# Altium footprint library Blue Tractor-2021.PcbLib: 82 footprints (part 5 of 6)
Each footprint in its own frame and in the unit in brackets; x right, y up, seen from the top. Pads: shape width x height; smd on the part's side, far side on the other; paste and mask are expansions set on the pad; w line width, h text height; cw(c..) or ccw(c..) is an arc to the next point about the centre after c.
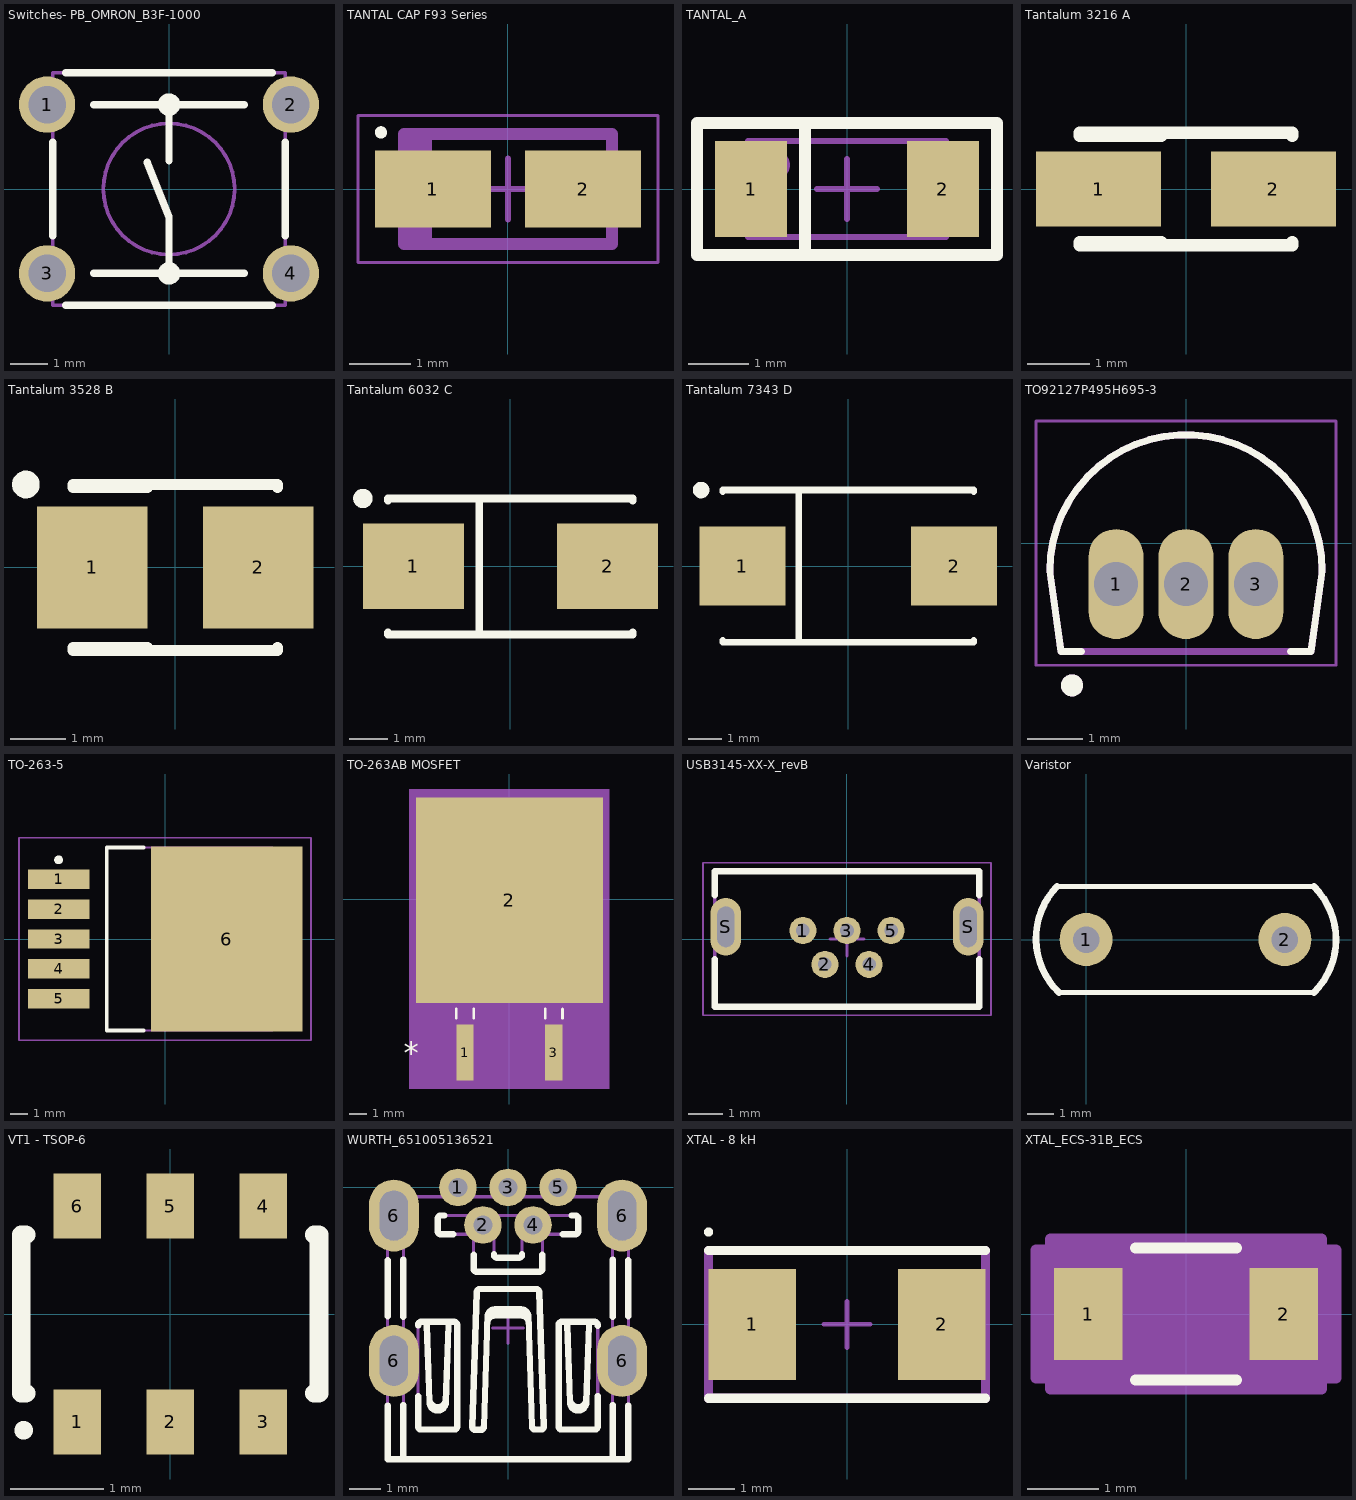
[diagram p4: the footprints below, top view; thin cyan lines are the x and y axes]

## Switches- PB_OMRON_B3F-1000 [mm] "6x6mm Model, Horizontal, Flat Plunger Type (without Ground Terminal) Pushbutton Switch, OMRON B3F Series"
height 4.5
pads (4):
  round 1.5 hole 1: 1(-3.25,2.25) 2(3.25,2.25) 3(-3.25,-2.25) 4(3.25,-2.25)
Top Overlay:
  circle w0.2: c0,-2.25 r0.2
  circle w0.2: c0,2.25 r0.2
  lines w0.2: -3.1,-1.25 -3.1,1.25 ; -2.75,-3.1 2.75,-3.1 ; -2.75,3.1 2.75,3.1 ; -2,-2.25 2,-2.25 ; -2,2.25 2,2.25 ; -0.586,0.716 0,-0.75 0,-2.25 ; 0,0.75 0,2.25 ; 3.1,-1.25 3.1,1.25
Mechanical 14:
  circle w0.1: c0,0 r1.75
  lines w0.1: -3.1,-2.6 -3.4,-2.6 -3.4,-1.9 -3.1,-1.9 ; -3.1,1.9 -3.4,1.9 -3.4,2.6 -3.1,2.6 ; 3.1,-2.6 3.4,-2.6 3.4,-1.9 3.1,-1.9 ; 3.1,1.9 3.4,1.9 3.4,2.6 3.1,2.6 ; -3.1,-3.1 -3.1,3.1 3.1,3.1 3.1,-3.1 -3.1,-3.1
3D body "PB_OMRON_B3F-1000.stp": height 4.3, standoff -3.6, extent -3.4,-3.1 3.4,3.1

## TANTAL CAP F93 Series [mm] "Molded Capacitor 1206, 2-Leads, Body 3,20x1,60mm, IPC Medium Density"
height 1.8
pads (2):
  rect 1.9x1.25 smd: 1(-1.225,0) 2(1.225,0)
Top Overlay:
  circle w0.1: c-2.075,0.925 r0.05
Mechanical 13:
  rectangle: -1.7,-0.9 -1.243,0.9
  lines w0.2: -1.7,-0.9 1.7,-0.9 1.7,0.9 -1.7,0.9 -1.7,-0.9
Mechanical 15:
  lines w0.05: -2.45,-1.2 2.45,-1.2 2.45,1.2 -2.45,1.2 -2.45,-1.2
  lines w0.1: -0.5,0 0.5,0 ; 0,-0.5 0,0.5
3D body: height 1.8, standoff 0, extent -1.7,-0.9 1.7,0.9

## TANTAL_A [mm]
height 1.6
pads (3):
  rect 1.2x1.6 smd: 1(-1.6,0) 2(1.6,0)
  round 0.5 on Mech13: ""(-1.2,0.4)
Top Overlay:
  lines w0.2: -0.7,-1.1 -0.7,1.1 ; -2.5,-1.1 -2.5,1.1 2.5,1.1 2.5,-1.1 -2.5,-1.1
Mechanical 13:
  lines w0.1: -1.651,-0.8 1.651,-0.8 1.651,0.8 -1.651,0.8 -1.651,-0.8
Mechanical 15:
  lines w0.1: -0.5,0 0.5,0 ; 0,-0.5 0,0.5 ; -2.5,-1.1 2.5,-1.1 2.5,1.1 -2.5,1.1 -2.5,-1.1
3D body "User Library-AVX_ACASE.STEP": height 1.71, standoff 0, extent -1.7,-0.84 1.7,0.84

## Tantalum 3216 A [mm] "Capacitor, SM Tantalum; Body 3.2 x 1.6 mm (LxW typ)"
height 1.8
pads (2):
  rect 2x1.2 smd: 1(-1.4,0) 2(1.4,0)
Top Overlay:
  lines w0.2: -1.7,-0.9 1.7,-0.9 1.7,-0.85 ; -1.7,-0.85 -0.4,-0.85 ; -1.7,0.85 -0.4,0.85 ; -1.7,0.9 1.7,0.9 1.7,0.85
3D body "User Library-CaseA_3216-18.step": height 1.6, standoff 0, extent -1.6,-0.8 1.6,0.8

## Tantalum 3528 B [mm] "Capacitor, SM Tantalum; Body 3.5 x 2.8 mm (LxW typ)"
height 2.1
pads (2):
  rect 2x2.2 smd: 1(-1.5,0) 2(1.5,0)
Top Overlay:
  circle w0.25: c-2.7,1.5 r0.125
  lines w0.2: -1.85,-1.5 1.85,-1.5 1.85,-1.45 ; -1.85,-1.45 -0.5,-1.45 ; -1.85,1.45 -0.5,1.45 ; -1.85,1.5 1.85,1.5 1.85,1.45
3D body "User Library-CaseB_3528-21.step": height 1.9, standoff 0, extent -1.75,-1.4 1.75,1.4

## Tantalum 6032 C [mm] "Capacitor, SM Tantalum; Body 6.0 x 3.2 mm (LxW typ)"
height 2.8
pads (2):
  rect 2.6x2.2 smd: 1(-2.5,0) 2(2.5,0)
Top Overlay:
  circle w0.25: c-3.8,1.75 r0.125
  lines w0.2: -3.15,-1.7 -3.15,-1.75 3.15,-1.75 3.15,-1.7 ; -3.15,1.7 -3.15,1.75 3.15,1.75 3.15,1.7 ; -0.8,-1.75 -0.8,1.75
3D body "User Library-CaseC_6032-28.step": height 2.5, standoff 0, extent -3,-1.6 3,1.6

## Tantalum 7343 D [mm] "Capacitor, SM Tantalum; Body 7.3 x 4.3 mm (LxW typ)"
height 3.1
pads (2):
  rect 2.6x2.4 smd: 1(-3.2,0) 2(3.2,0)
Top Overlay:
  circle w0.25: c-4.45,2.3 r0.125
  lines w0.2: -3.8,-2.25 -3.8,-2.3 3.8,-2.3 3.8,-2.25 ; -3.8,2.25 -3.8,2.3 3.8,2.3 3.8,2.25 ; -1.5,-2.3 -1.5,2.3
3D body "User Library-CaseD_7343-31.step": height 2.8, standoff 0, extent -3.65,-2.15 3.65,2.15

## TO92127P495H695-3 [mm]
pads (3):
  oval 1x2 hole 0.8: 1(-1.27,-0.745) 2(0,-0.745) 3(1.27,-0.745)
Top Overlay:
  circle w0.2: c-2.07,-2.585 r0.1
  lines w0.127: -1.9,-1.97 -2.27,-1.97 -2.475,-0.505 cw(c0,-0.505) 2.475,-0.505 2.27,-1.97 1.9,-1.97
Mechanical 13:
  circle w0.2: c-2.07,-2.585 r0.1
  lines w0.127: -2.475,-0.505 cw(c0,-0.505) 2.475,-0.505 2.27,-1.97 -2.27,-1.97 -2.475,-0.505
Mechanical 15:
  lines w0.05: -2.725,-2.22 2.725,-2.22 2.725,2.22 -2.725,2.22 -2.725,-2.22
3D body "ALSRobot-TO-92A.step": height 9, standoff -2, extent -2.4,-2.275 2.4,1.655

## TO-263-5 [mm] "D2-PAK, 6-Leads, Body 8.6x10.2mm, Pitch 1.7mm, Lead Span 14.1mm, IPC Low Density"
height 4.65
pads (6):
  rect 3.5x1.1 smd: 1(-6.05,3.4) 2(-6.05,1.7) 3(-6.05,0) 4(-6.05,-1.7) 5(-6.05,-3.4)
  rect 8.6x10.5 smd: 6(3.5,0)
Top Overlay:
  circle w0.25: c-6.05,4.5 r0.125
  lines w0.2: -1.2,-5.2 -3.3,-5.2 -3.3,5.2 -1.2,5.2
Mechanical 13:
  lines w0.1: -3.3,-5.2 6.1,-5.2 6.1,5.2 -3.3,5.2 -3.3,-5.2
Mechanical 15:
  lines w0.1: -0.5,0 0.5,0 ; 0,-0.5 0,0.5 ; -8.3,-5.75 8.3,-5.75 8.3,5.75 -8.3,5.75 -8.3,-5.75
3D body "User Library-TO-263-5.STEP": height 4.56, standoff 0, extent -6.927,-5.08 7.088,5.08

## TO-263AB MOSFET [mil] "D2PAK_VIS-L"
pads (3):
  rect 39x126 smd paste+0 mask+0: 1(-100,-345) 3(100,-345)
  rect 420x462 smd paste+0 mask+0: 2(0,-2)
Top Overlay:
  lines w6: -119.5,-268 -119.5,-247 ; -80.5,-268 -80.5,-247 ; 80.5,-268 80.5,-247 ; 119.5,-268 119.5,-247
  text "*" at -237.5,-370 h50
Mechanical 5:
  region: -225,248 225,248 225,-427 -225,-427
Mechanical 13:
  lines w1: -35,-223 -35,-293 35,-293 35,-223 ; -210,-223 -210,223 210,223 210,-223 -210,-223 ; -119.5,-402 -80.5,-402 -80.5,-223 -119.5,-223 -119.5,-402 ; 80.5,-402 119.5,-402 119.5,-223 80.5,-223 80.5,-402
  text "*" at -112.5,-238 h50
Mechanical 15:
  region: -123.5,-237 -214,-237 -214,233 214,233 214,-237 123.5,-237 123.5,-412 76.5,-412 76.5,-286 -76.5,-286 -76.5,-412 -123.5,-412
  lines w6: -214,-237 -123.5,-237 -123.5,-412 -76.5,-412 -76.5,-286 76.5,-286 76.5,-412 123.5,-412 123.5,-237 214,-237 214,233 -214,233 -214,-237
3D body "D2PAK_VIS.step": height 190.12, standoff -2.01, extent -210,-325.51 210,223.11

## USB3145-XX-X_revB [mm] "Micro USB Receptacle, Type B, Through-Hole, Vertical,  with Through-Hole Shell Stakes"
height 6
pads (7):
  round 0.8 hole 0.4: 1(-1.3,0.25) 2(-0.65,-0.75) 3(0,0.25) 4(0.65,-0.75) 5(1.3,0.25)
  oval 0.9x1.7 hole 0.5 slot 1.2 at 90 deg: S(-3.575,0.36) S(3.575,0.36)
Top Overlay:
  lines w0.2: -3.9,-0.6 -3.9,-2 3.9,-2 3.9,-0.6 ; -3.9,1.3 -3.9,2 3.9,2 3.9,1.3
Mechanical 13:
  lines w0.1: -3.9,-2 -3.9,2 3.9,2 3.9,-2 -3.9,-2
Mechanical 15:
  lines w0.05: -4.25,-2.25 4.25,-2.25 4.25,2.25 -4.25,2.25 -4.25,-2.25
  lines w0.1: -0.5,0 0.5,0 ; 0,-0.5 0,0.5
3D body "usb3145-30-1-x_revb.step": height 6.6, standoff -2.2, extent -3.901,-2 3.901,2

## Varistor [mm]
pads (2):
  round 2 hole 1: 1(0,0) 2(7.5,0)
Top Overlay:
  lines w0.2: -1.1,2 8.6,2 ; -1.025,-2 8.6,-2
  lines w0.254: -1.1,2 ccw(c0.937,0.038) -1.025,-2 ; 8.6,-2 ccw(c6.6,0) 8.6,2
3D body: height 10, standoff 0, extent 0.932,-1.905 6.468,1.906

## VT1 - TSOP-6 [mm] "SI3493DDV"
height 1.1
pads (6):
  rect 0.508x0.699 smd: 1(-1,-1.16) 2(0,-1.16) 3(1,-1.16) 4(1,1.16) 5(0,1.16) 6(-1,1.16)
Top Overlay:
  circle w0.1: c-1.575,-1.25 r0.05
  lines w0.2: -1.55,-0.85 -1.6,-0.85 -1.6,0.85 -1.55,0.85 ; 1.55,-0.85 1.6,-0.85 1.6,0.85 1.55,0.85

## WURTH_651005136521 [mm] "Mini USB Type B Horizontal 5 Contacts"
height 3.9
pads (9):
  round 1.2 hole 0.6: 1(-1.6,0) 2(-0.8,-1.2) 3(0,0) 4(0.8,-1.2) 5(1.6,0)
  oval 1.6x2.3 hole 0.9 slot 1.6 at 90 deg: 6(-3.65,-5.55) 6(-3.65,-0.9) 6(3.65,-5.55) 6(3.65,-0.9)
Top Overlay:
  lines w0.2: -3.85,-6.982 -3.85,-8.7 3.85,-8.7 3.85,-6.982 ; -3.85,-4.118 -3.85,-2.332 ; -3.35,-8.7 -3.35,-6.958 ; -3.35,-4.142 -3.35,-2.308 ; -2.875,-6.681 -2.875,-7.65 ccw(c-2.775,-7.65) -2.775,-7.75 -1.725,-7.75 ccw(c-1.725,-7.65) -1.625,-7.65 -1.625,-4.4 ccw(c-1.725,-4.4) -1.725,-4.3 -2.775,-4.3 ccw(c-2.775,-4.4) -2.875,-4.4 -2.875,-4.419 ; -2.694,-4.3 cw(c-2.694,-4.396) -2.597,-4.396 -2.509,-6.881 ccw(c-2.25,-6.881) -1.991,-6.881 -1.904,-4.396 ; -2.513,-6.771 ccw(c-2.25,-6.769) -1.987,-6.769 ; -2.036,-0.9 -2.15,-0.9 ccw(c-2.15,-1) -2.25,-1 -2.25,-1.4 ccw(c-2.15,-1.4) -2.15,-1.5 -1.754,-1.5 ; -1.904,-4.403 cw(c-1.801,-4.403) -1.801,-4.3 ; -1.1,-2.154 -1.1,-2.6 ccw(c-1,-2.6) -1,-2.7 1,-2.7 ccw(c1,-2.6) 1.1,-2.6 1.1,-2.154 ; -0.661,-4.328 cw(c-0.425,-4.336) -0.425,-4.1 0.425,-4.1 cw(c0.425,-4.336) 0.661,-4.328 ; -0.45,-2.137 -0.45,-2.15 ccw(c-0.35,-2.15) -0.35,-2.25 0.35,-2.25 ccw(c0.35,-2.15) 0.45,-2.15 0.45,-2.137 ; 1.754,-1.5 2.15,-1.5 ccw(c2.15,-1.4) 2.25,-1.4 2.25,-1 ccw(c2.15,-1) 2.15,-0.9 2.036,-0.9 ; 1.802,-4.3 cw(c1.802,-4.396) 1.898,-4.396 1.987,-6.881 ccw(c2.246,-6.881) 2.504,-6.881 2.592,-4.396 ; 1.983,-6.771 ccw(c2.246,-6.769) 2.508,-6.769 ; 2.591,-4.403 cw(c2.695,-4.403) 2.695,-4.3 ; 2.871,-6.676 2.871,-7.65 cw(c2.771,-7.65) 2.771,-7.75 1.721,-7.75 cw(c1.721,-7.65) 1.621,-7.65 1.621,-4.4 cw(c1.721,-4.4) 1.721,-4.3 2.771,-4.3 cw(c2.771,-4.4) 2.871,-4.4 2.871,-4.424 ; 3.35,-8.7 3.35,-6.958 ; 3.35,-4.142 3.35,-2.308 ; 3.85,-4.118 3.85,-2.332 ; -1.147,-7.653 ccw(c-1.047,-7.657) -1.047,-7.757 -0.872,-7.757 ccw(c-0.872,-7.657) -0.772,-7.66 -0.654,-4.129 cw(c-0.418,-4.137) -0.418,-3.901 0.418,-3.901 cw(c0.418,-4.137) 0.654,-4.129 0.772,-7.653 ccw(c0.872,-7.65) 0.872,-7.75 1.047,-7.75 ccw(c1.047,-7.65) 1.147,-7.647 0.999,-3.347 ccw(c0.9,-3.35) 0.9,-3.25 -0.9,-3.25 ccw(c-0.9,-3.35) -0.999,-3.347 -1.147,-7.653
Mechanical 8:
  lines w0.1: -3.9,-5.9 -3.65,-5.9 ; -3.9,-5.55 -3.65,-5.55 ; -3.9,-5.2 -3.65,-5.2 ; -3.9,-1.25 -3.65,-1.25 ; -3.9,-0.9 -3.65,-0.9 ; -3.9,-0.55 -3.65,-0.55 ; -3.65,-6.15 -3.65,-5.9 ; -3.65,-5.8 -3.65,-5.55 ; -3.65,-5.3 -3.65,-5.55 ; -3.65,-4.95 -3.65,-5.2 ; -3.65,-1.5 -3.65,-1.25 ; -3.65,-1.15 -3.65,-0.9 ; -3.65,-0.65 -3.65,-0.9 ; -3.65,-0.3 -3.65,-0.55 ; -3.4,-5.9 -3.65,-5.9 ; -3.4,-5.55 -3.65,-5.55 ; -3.4,-5.2 -3.65,-5.2 ; -3.4,-1.25 -3.65,-1.25 ; -3.4,-0.9 -3.65,-0.9 ; -3.4,-0.55 -3.65,-0.55 ; -2.1,0 -1.6,0 ; -1.6,-0.5 -1.6,0 ; -1.6,0.5 -1.6,0 ; -1.3,-1.2 -0.8,-1.2 ; -1.1,0 -1.6,0 ; -0.8,-1.7 -0.8,-1.2 ; -0.8,-0.7 -0.8,-1.2 ; -0.5,-4.5 0,-4.5 ; -0.5,0 0,0 ; -0.3,-1.2 -0.8,-1.2 ; 0,-5 0,-4.5 ; 0,-4 0,-4.5 ; 0,-0.5 0,0 ; 0,0.5 0,0 ; 0.3,-1.2 0.8,-1.2 ; 0.5,-4.5 0,-4.5 ; 0.5,0 0,0 ; 0.8,-1.7 0.8,-1.2 ; 0.8,-0.7 0.8,-1.2 ; 1.1,0 1.6,0 ; 1.3,-1.2 0.8,-1.2 ; 1.6,-0.5 1.6,0 ; 1.6,0.5 1.6,0 ; 2.1,0 1.6,0 ; 3.4,-5.9 3.65,-5.9 ; 3.4,-5.55 3.65,-5.55 ; 3.4,-5.2 3.65,-5.2 ; 3.4,-1.25 3.65,-1.25 ; 3.4,-0.9 3.65,-0.9 ; 3.4,-0.55 3.65,-0.55 ; 3.65,-6.15 3.65,-5.9 ; 3.65,-5.8 3.65,-5.55 ; 3.65,-5.3 3.65,-5.55 ; 3.65,-4.95 3.65,-5.2 ; 3.65,-1.5 3.65,-1.25 ; 3.65,-1.15 3.65,-0.9 ; 3.65,-0.65 3.65,-0.9 ; 3.65,-0.3 3.65,-0.55 ; 3.9,-5.9 3.65,-5.9 ; 3.9,-5.55 3.65,-5.55 ; 3.9,-5.2 3.65,-5.2 ; 3.9,-1.25 3.65,-1.25 ; 3.9,-0.9 3.65,-0.9 ; 3.9,-0.55 3.65,-0.55 ; -4.1,-5.9 ccw(c-3.65,-5.9) -3.2,-5.9 -3.2,-5.2 ccw(c-3.65,-5.2) -4.1,-5.2 -4.1,-5.9 ; -4.1,-1.25 ccw(c-3.65,-1.25) -3.2,-1.25 -3.2,-0.55 ccw(c-3.65,-0.55) -4.1,-0.55 -4.1,-1.25 ; 3.2,-5.9 ccw(c3.65,-5.9) 4.1,-5.9 4.1,-5.2 ccw(c3.65,-5.2) 3.2,-5.2 3.2,-5.9 ; 3.2,-1.25 ccw(c3.65,-1.25) 4.1,-1.25 4.1,-0.55 ccw(c3.65,-0.55) 3.2,-0.55 3.2,-1.25
Mechanical 14:
  lines w0.1: -3.85,-5.955 cw(c-3.675,-5.595) -4.075,-5.595 -4.075,-5.505 cw(c-3.675,-5.505) -3.85,-5.145 ; -3.85,-1.305 cw(c-3.675,-0.945) -4.075,-0.945 -4.075,-0.855 cw(c-3.675,-0.855) -3.85,-0.495 ; -3.35,-8.7 -3.35,-0.3 ; -2.694,-4.3 cw(c-2.694,-4.396) -2.597,-4.396 -2.509,-6.881 ccw(c-2.25,-6.881) -1.991,-6.881 -1.904,-4.396 ; -2.513,-6.771 ccw(c-2.25,-6.769) -1.987,-6.769 ; -1.904,-4.403 cw(c-1.801,-4.403) -1.801,-4.3 ; -1.8,-0.3 -1.8,0.125 -1.4,0.125 -1.4,-0.3 ; -0.661,-4.328 cw(c-0.425,-4.336) -0.425,-4.1 0.425,-4.1 cw(c0.425,-4.336) 0.661,-4.328 ; -0.55,-0.9 cw(c-0.55,-1) -0.45,-1 -0.45,-2.15 ccw(c-0.35,-2.15) -0.35,-2.25 0.35,-2.25 ccw(c0.35,-2.15) 0.45,-2.15 0.45,-1 cw(c0.55,-1) 0.55,-0.9 ; -0.2,-0.3 -0.2,0.125 0.2,0.125 0.2,-0.3 ; 1.4,-0.3 1.4,0.125 1.8,0.125 1.8,-0.3 ; 1.802,-4.3 cw(c1.802,-4.396) 1.898,-4.396 1.987,-6.881 ccw(c2.246,-6.881) 2.504,-6.881 2.592,-4.396 ; 1.983,-6.771 ccw(c2.246,-6.769) 2.508,-6.769 ; 2.591,-4.403 cw(c2.695,-4.403) 2.695,-4.3 ; 3.35,-8.7 3.35,-0.3 ; 3.85,-5.955 ccw(c3.675,-5.595) 4.075,-5.595 4.075,-5.505 ccw(c3.675,-5.505) 3.85,-5.145 ; 3.85,-1.305 ccw(c3.675,-0.945) 4.075,-0.945 4.075,-0.855 ccw(c3.675,-0.855) 3.85,-0.495 ; -3.85,-8.7 -3.85,-0.3 3.85,-0.3 3.85,-8.7 -3.85,-8.7 ; -2.875,-7.65 ccw(c-2.775,-7.65) -2.775,-7.75 -1.725,-7.75 ccw(c-1.725,-7.65) -1.625,-7.65 -1.625,-4.4 ccw(c-1.725,-4.4) -1.725,-4.3 -2.775,-4.3 ccw(c-2.775,-4.4) -2.875,-4.4 -2.875,-7.65 ; -2.25,-1.4 ccw(c-2.15,-1.4) -2.15,-1.5 -1.2,-1.5 cw(c-1.2,-1.6) -1.1,-1.6 -1.1,-2.6 ccw(c-1,-2.6) -1,-2.7 1,-2.7 ccw(c1,-2.6) 1.1,-2.6 1.1,-1.6 cw(c1.2,-1.6) 1.2,-1.5 2.15,-1.5 ccw(c2.15,-1.4) 2.25,-1.4 2.25,-1 ccw(c2.15,-1) 2.15,-0.9 -2.15,-0.9 ccw(c-2.15,-1) -2.25,-1 -2.25,-1.4 ; -1.147,-7.653 ccw(c-1.047,-7.657) -1.047,-7.757 -0.872,-7.757 ccw(c-0.872,-7.657) -0.772,-7.66 -0.654,-4.129 cw(c-0.418,-4.137) -0.418,-3.901 0.418,-3.901 cw(c0.418,-4.137) 0.654,-4.129 0.772,-7.653 ccw(c0.872,-7.65) 0.872,-7.75 1.047,-7.75 ccw(c1.047,-7.65) 1.147,-7.647 0.999,-3.347 ccw(c0.9,-3.35) 0.9,-3.25 -0.9,-3.25 ccw(c-0.9,-3.35) -0.999,-3.347 -1.147,-7.653 ; 1.621,-7.65 ccw(c1.721,-7.65) 1.721,-7.75 2.771,-7.75 ccw(c2.771,-7.65) 2.871,-7.65 2.871,-4.4 ccw(c2.771,-4.4) 2.771,-4.3 1.721,-4.3 ccw(c1.721,-4.4) 1.621,-4.4 1.621,-7.65
3D body "WURTH_651005136521.stp": height 3.9, standoff -2.6, extent -4.075,-8.7 4.075,0.125

## XTAL - 8 kH [mm] "ABM3"
height 1.3
pads (2):
  rect 1.9x2.4 smd: 1(-2.05,0) 2(2.05,0)
Top Overlay:
  circle w0.1: c-3,2 r0.05
  lines w0.2: -3,-1.6 3,-1.6 ; -3,1.6 3,1.6
Mechanical 13:
  lines w0.2: -3,-1.6 3,-1.6 3,1.6 -3,1.6 -3,0.8 -3,-0.8 -3,-1.6
Mechanical 15:
  lines w0.05: -3,-1.6 3,-1.6 3,1.6 -3,1.6 -3,-1.6
  lines w0.1: -0.5,0 0.5,0 ; 0,-0.5 0,0.5
3D body: height 1.3, standoff 0, extent -3,-1.6 3,1.6

## XTAL_ECS-31B_ECS [mil]
pads (2):
  rect 38x51 smd paste+0 mask+0: 1(-54,0) 2(54,0)
Top Overlay:
  lines w6: -27.89,-36.5 27.89,-36.5 ; -27.89,36.5 27.89,36.5
Mechanical 13:
  lines w1: -65,-31.5 -65,31.5 65,31.5 65,-31.5 -65,-31.5 ; -65,-25.5 -59,-25.5 -59,25.5 -65,25.5 -65,-25.5 ; 59,-25.5 59,25.5 65,25.5 65,-25.5 59,-25.5
Mechanical 15:
  region: -75,-35.5 -83,-35.5 -83,35.5 -75,35.5 -75,41.5 75,41.5 75,35.5 83,35.5 83,-35.5 75,-35.5 75,-41.5 -75,-41.5
  lines w6: -83,-35.5 -75,-35.5 -75,-41.5 75,-41.5 75,-35.5 83,-35.5 83,35.5 75,35.5 75,41.5 -75,41.5 -75,35.5 -83,35.5 -83,-35.5
3D body "XTAL_ECS-31B_ECS.step": height 35.12, standoff 0, extent -63.31,-31.5 63.31,31.5